# Altium footprint library PCBLIB.PcbLib: 775 footprints (part 12 of 49)
Each footprint in its own frame and in the unit in brackets; x right, y up, seen from the top. Pads: shape width x height; smd on the part's side, far side on the other; paste and mask are expansions set on the pad; w line width, h text height; cw(c..) or ccw(c..) is an arc to the next point about the centre after c.
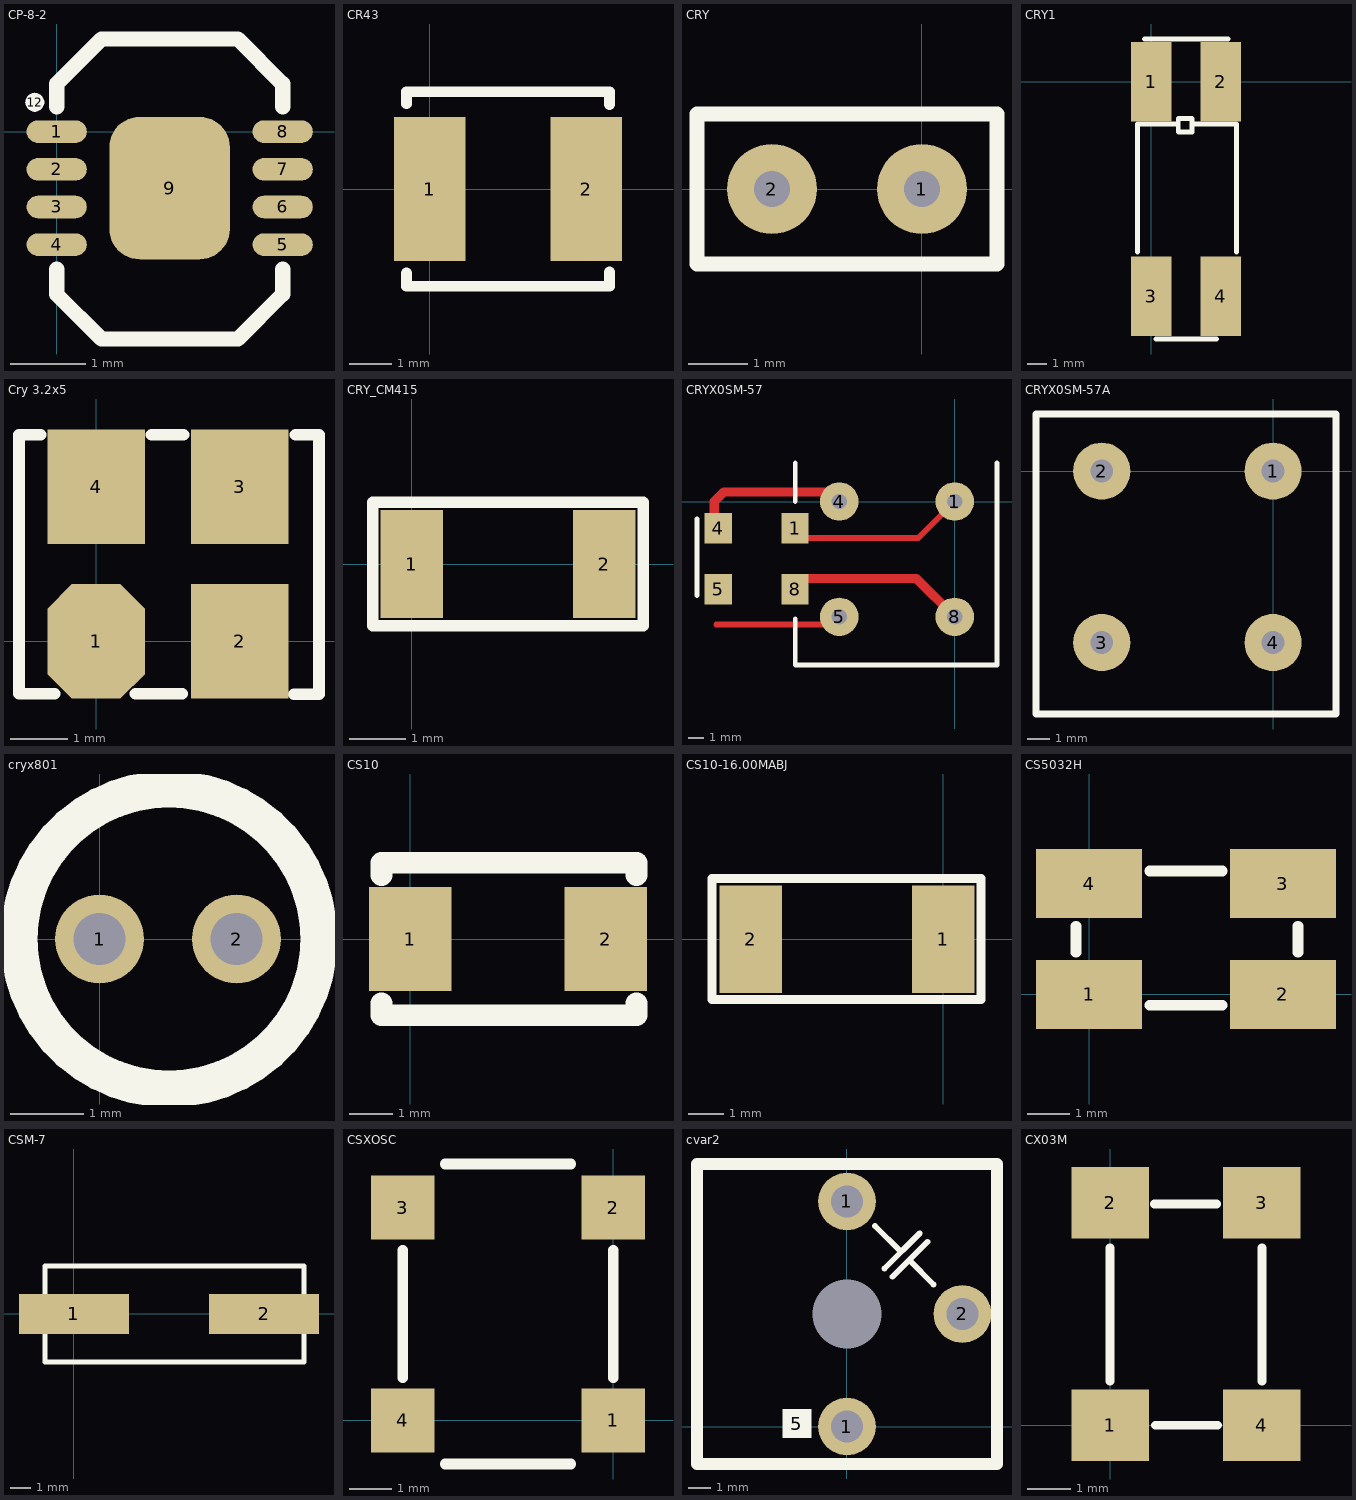
[diagram p11: the footprints below, top view; thin cyan lines are the x and y axes]

## CP-8-2 [mm]
height 0.001
pads (10):
  oval 0.8x0.3 smd: 1(0,0) 2(0,-0.5) 3(0,-1) 4(0,-1.5) 5(3,-1.5) 6(3,-1) 7(3,-0.5) 8(3,0)
  rrect50% 1.6x1.89 smd: 9(1.5,-0.75)
  round 0.254 on Top Overlay: 12(-0.291,0.39)
TopOverlay:
  lines w0.203: 0,-1.829 0,-2.159 0.594,-2.753 2.406,-2.753 3,-2.159 3,-1.829 ; 0,0.33 0,0.635 0.595,1.23 2.405,1.23 3,0.635 3,0.33

## CR43 [mm]
pads (2):
  rect 1.7x3.4 smd: 1(0,0) 2(3.7,0)
TopOverlay:
  lines w0.254: -0.55,-1.99 -0.55,-2.3 4.25,-2.3 4.25,-1.964 ; -0.55,2.015 -0.55,2.3 4.25,2.3 4.25,1.998
Mechanical4:
  text ".1" at 0,0 h0.03

## CRY [mil]
height 10
pads (2):
  round 60 hole 24: 1(0,0) 2(-100,0)
TopOverlay:
  lines w10: -150,-50 -150,50 50,50 50,-50 -150,-50

## CRY1 [mm]
pads (4):
  rect 2.1x4.1 smd: 1(0,0) 2(3.6,0) 3(0,-11.1) 4(3.6,-11.1)
TopOverlay:
  lines w0.254: -0.7,-8.8 -0.7,-2.2 1.4,-2.2 ; -0.339,2.2 3.979,2.2 ; 0.246,-13.3 3.37,-13.3 ; 2.2,-2.2 4.4,-2.2 4.4,-8.8 ; 1.4,-2.6 2.1,-2.6 2.1,-1.9 1.4,-1.9 1.4,-2.6
Mechanical4:
  text ".181" at 0,0 h0.03

## Cry 3.2x5 [mm]
height 1.524
pads (4):
  oct 1.7x2 smd: 1(0,0)
  rect 1.7x2 smd: 2(2.5,0) 3(2.5,2.7) 4(0,2.7)
TopOverlay:
  lines w0.203: -0.965,3.607 -1.346,3.607 -1.346,-0.914 -0.721,-0.914 ; 0.686,-0.914 1.499,-0.914 ; 0.965,3.607 1.524,3.607 ; 3.45,-0.92 3.886,-0.92 3.886,3.607 3.475,3.607
  text "." at -1.215,-0.781 h1.27
Mechanical4:
  text ".100" at 0,0 h0.03
3D body: height 1, standoff 0, extent -1.245,-0.228 3.755,2.972

## CRY_CM415 [mm]
pads (2):
  rect 1.1x1.9 smd: 1(0,0) 2(3.4,0)
TopOverlay:
  lines w0.203: -0.686,-1.092 4.089,-1.092 4.089,1.092 -0.686,1.092 -0.686,-1.092

## CRYX0SM-57 [mil]
pads (8):
  rect 71x79 smd: 1(-415,-70) 4(-615,-70) 5(-615,-228) 8(-415,-228)
  round 100 hole 40: 1(0,0) 4(-300,0) 5(-300,-300) 8(0,-300)
TopLayer:
  lines w12: -325,25 -300,0
  lines w15: -620,-320 -320,-320 -300,-300 ; -400,-95 -95,-95 -85,-85 0,0
  lines w24: -625,-75 -625,0 -600,25 -325,25 ; -410,-200 -100,-200 0,-300
TopOverlay:
  lines w12: -670,-245 -670,-45 ; -415,-305 -415,-425 110,-425 110,100 ; -415,0 -415,100

## CRYX0SM-57A [mil]
pads (4):
  round 100 hole 40: 1(0,0) 2(-300,0) 3(-300,-300) 4(0,-300)
TopOverlay:
  lines w12: -415,-308 -415,0 -415,100 110,100 110,-425 -415,-425 -415,-305

## cryx801 [mil]
pads (2):
  round 48 hole 28: 1(0,0) 2(74,0)
TopOverlay:
  circle w20: c37.5,0 r81

## CS10 [mm]
height 1.2
pads (2):
  rect 1.9x2.4 smd: 1(0,0) 2(4.5,0)
TopOverlay:
  lines w0.5: -0.66,-1.474 -0.66,-1.75 5.207,-1.75 5.207,-1.474 ; -0.66,1.474 -0.66,1.75 5.207,1.753 5.207,1.473

## CS10-16.00MABJ [mil]
pads (2):
  rect 70x120 smd: 1(0,0) 2(-215,0)
TopOverlay:
  lines w10: -258,-67 -258,68 42,68 42,-67 -258,-67

## CS5032H [mil]
pads (4):
  rect 98x64 smd: 1(0,0) 2(179.13,0) 3(179.13,102.36) 4(0,102.36)
TopOverlay:
  lines w10: -12,39 -12,63 ; 56,-10 123,-10 ; 56,114 123,114 ; 193,39 193,63
  text "." at -15,-51 h60

## CSM-7 [mm]
height 3.81
pads (2):
  rect 5.5x2 smd: 1(0,0) 2(9.5,0)
TopOverlay:
  lines w0.254: -1.45,-1 -1.45,-2.4 11.5,-2.4 11.5,-1 ; -1.45,1 -1.45,2.4 11.5,2.4 11.5,1
Mechanical4:
  text ".155" at 0,0 h0.03

## CSXOSC [mil]
height 65
pads (4):
  rect 60x60 smd: 1(0,0) 2(0,200) 3(-198,200) 4(-198,0)
TopOverlay:
  lines w10: -198,40 -198,160 ; -158,-41 -40,-41 ; -158,241 -40,241 ; 0,40 0,160
  text "." at 40,-7 h50

## cvar2 [mil]
height 430
pads (5):
  round 100 hole 55: 1(0,0) 1(0,390) 2(200,195)
  rect 50x50 on Top Overlay: 5(-86.86,5.18)
  round 0 hole 120: ""(0,195)
TopOverlay:
  lines w10: 48.71,347.44 92.99,303.15 ; 65.04,273.73 126.29,334.98 ; 78.97,259.61 139.48,320.13 ; 107.75,288.39 149.82,246.33
  lines w20: -260,-65 -260,455 260,455 260,-65 -260,-65

## CX03M [mil]
pads (4):
  rect 70x65 smd: 1(0,0) 2(0,201) 3(137,201) 4(137,0)
TopOverlay:
  lines w8: 0,40 0,160 ; 40,200 96,200 ; 41,0 97,0 ; 137,40 137,160
  text "." at -56,-44 h50